# Altium footprint library Zmod.PcbLib: 229 footprints (part 3 of 15)
Each footprint in its own frame and in the unit in brackets; x right, y up, seen from the top. Pads: shape width x height; smd on the part's side, far side on the other; paste and mask are expansions set on the pad; w line width, h text height; cw(c..) or ccw(c..) is an arc to the next point about the centre after c.
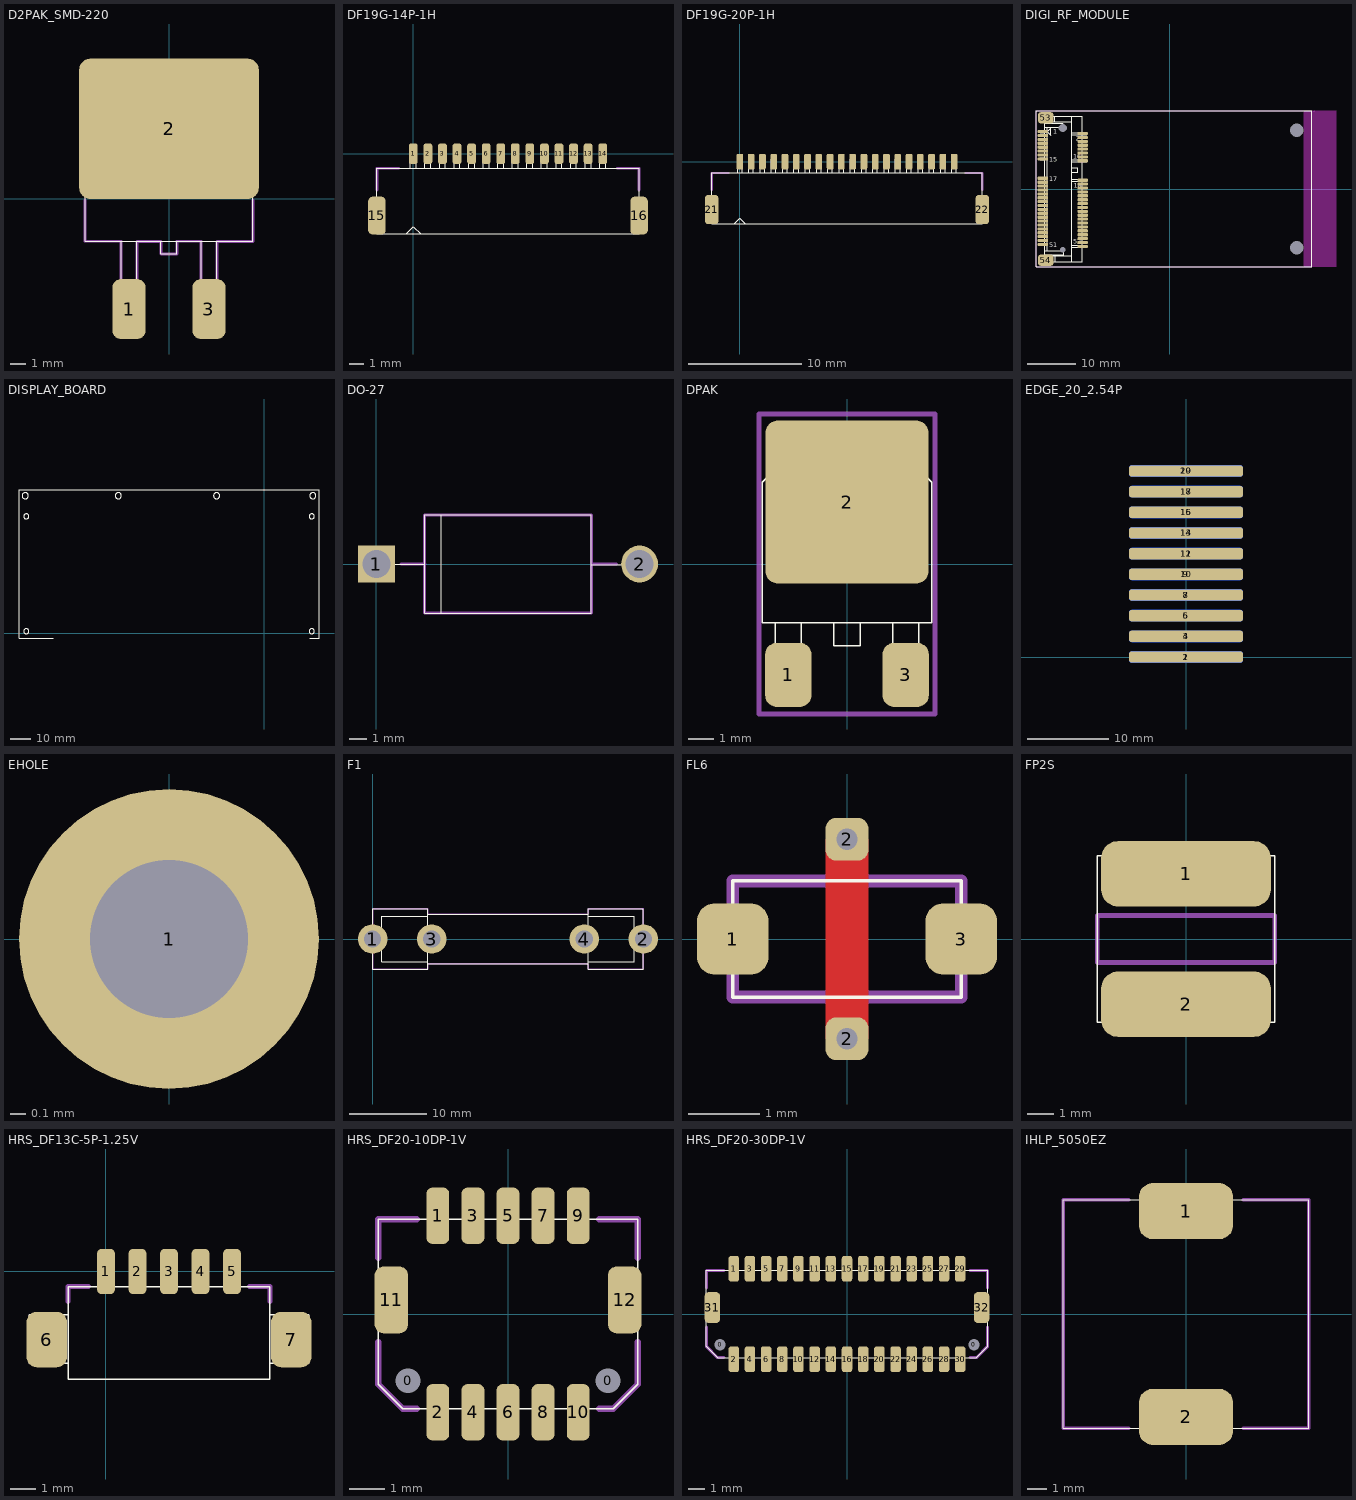
[diagram p2: the footprints below, top view; thin cyan lines are the x and y axes]

## D2PAK_SMD-220 [mm] "Internaiton Rectifier  Rev. 1"
height 4.9
pads (3):
  rrect50% 2.1x3.8 smd: 1(-2.54,-7) 3(2.54,-7)
  rrect15% 11.4x8.9 smd: 2(0,4.45)
Top Overlay:
  lines w0.05: -5.33,6.55 5.33,6.55 ; -3.04,-2.7 -3.04,-5.4 -2.04,-5.4 -2.04,-2.7 ; -2.88,-5.4 -2.88,-7.95 -2.21,-7.95 -2.21,-5.4 ; -0.51,-2.7 -0.51,-3.5 0.49,-3.5 0.49,-2.71 ; 2.04,-2.7 2.04,-5.4 3.04,-5.4 3.04,-2.7 ; 2.2,-5.4 2.2,-7.95 2.87,-7.95 2.87,-5.4 ; -5.33,-2.7 5.33,-2.7 5.33,6.67 4.05,7.95 -4.05,7.95 -5.33,6.67 -5.33,-2.7
Mechanical 15:
  lines w0.18: -5.33,-0.09 -5.33,-2.69 -3.04,-2.69 -3.04,-5.27 ; -2.04,-5.29 -2.04,-2.7 -0.5,-2.7 -0.5,-3.51 0.5,-3.51 0.5,-2.7 ; 0.51,-2.69 2.04,-2.69 2.04,-5.3 ; 3.04,-5.31 3.04,-2.7 5.33,-2.7 5.33,-0.08
  text ".Designator" at -5.055,-1.827 h1.5

## DF19G-14P-1H [mm] "HRS DF19 Series 1mm pitch, 14 way, board to cable, Rev.2"
height 1.65
pads (16):
  rrect50% 0.6x1.4 smd paste+0: 1(0,0) 2(1,0) 3(2,0) 4(3,0) 5(4,0) 6(5,0) 7(6,0) 8(7,0) 9(8,0) 10(9,0) 11(10,0) 12(11,0) 13(12,0) 14(13,0)
  rrect50% 1.2x2.6 smd: 15(-2.5,-4.25) 16(15.5,-4.25)
Top Overlay:
  lines w0.05: -0.5,-5.5 0,-5 0.5,-5.5 ; -0.2,-1 -0.2,0.2 0.2,0.2 0.2,-1 ; 0.8,-1 0.8,0.2 1.2,0.2 1.2,-1 ; 1.8,-1 1.8,0.2 2.2,0.2 2.2,-1 ; 2.8,-1 2.8,0.2 3.2,0.2 3.2,-1 ; 3.8,-1 3.8,0.2 4.2,0.2 4.2,-1 ; 4.8,-1 4.8,0.2 5.2,0.2 5.2,-1 ; 5.8,-1 5.8,0.2 6.2,0.2 6.2,-1 ; 6.8,-1 6.8,0.2 7.2,0.2 7.2,-1 ; 7.8,-1 7.8,0.2 8.2,0.2 8.2,-1 ; 8.8,-1 8.8,0.2 9.2,0.2 9.2,-1 ; 9.8,-1 9.8,0.2 10.2,0.2 10.2,-1 ; 10.8,-1 10.8,0.2 11.2,0.2 11.2,-1 ; 11.8,-1 11.8,0.2 12.2,0.2 12.2,-1 ; 12.8,-1 12.8,0.2 13.2,0.2 13.2,-1 ; -2.5,-5.5 -2.5,-1 15.5,-1 15.5,-5.5 -2.5,-5.5
Mechanical 15:
  lines w0.2: -2.5,-2.5 -2.5,-1 -1,-1 ; 14,-1 15.5,-1 15.5,-2.5
  text ".Designator" at -1.25,-3.75 h1.5

## DF19G-20P-1H [mm] "HRS DF19 Series 1mm pitch, 20 way, board to cable, Rev.2"
height 1.65
pads (22):
  rrect50% 0.6x1.4 smd paste+0: 1(0,0) 2(1,0) 3(2,0) 4(3,0) 5(4,0) 6(5,0) 7(6,0) 8(7,0) 9(8,0) 10(9,0) 11(10,0) 12(11,0) 13(12,0) 14(13,0) 15(14,0) 16(15,0) 17(16,0) 18(17,0) 19(18,0) 20(19,0)
  rrect50% 1.2x2.6 smd: 21(-2.5,-4.25) 22(21.5,-4.25)
Top Overlay:
  lines w0.05: -0.5,-5.5 0,-5 0.5,-5.5 ; -0.2,-1 -0.2,0.2 0.2,0.2 0.2,-1 ; 0.8,-1 0.8,0.2 1.2,0.2 1.2,-1 ; 1.8,-1 1.8,0.2 2.2,0.2 2.2,-1 ; 2.8,-1 2.8,0.2 3.2,0.2 3.2,-1 ; 3.8,-1 3.8,0.2 4.2,0.2 4.2,-1 ; 4.8,-1 4.8,0.2 5.2,0.2 5.2,-1 ; 5.8,-1 5.8,0.2 6.2,0.2 6.2,-1 ; 6.8,-1 6.8,0.2 7.2,0.2 7.2,-1 ; 7.8,-1 7.8,0.2 8.2,0.2 8.2,-1 ; 8.8,-1 8.8,0.2 9.2,0.2 9.2,-1 ; 9.8,-1 9.8,0.2 10.2,0.2 10.2,-1 ; 10.8,-1 10.8,0.2 11.2,0.2 11.2,-1 ; 11.8,-1 11.8,0.2 12.2,0.2 12.2,-1 ; 12.8,-1 12.8,0.2 13.2,0.2 13.2,-1 ; 13.8,-1 13.8,0.2 14.2,0.2 14.2,-1 ; 14.8,-1 14.8,0.2 15.2,0.2 15.2,-1 ; 15.8,-1 15.8,0.2 16.2,0.2 16.2,-1 ; 16.8,-1 16.8,0.2 17.2,0.2 17.2,-1 ; 17.8,-1 17.8,0.2 18.2,0.2 18.2,-1 ; 18.8,-1 18.8,0.2 19.2,0.2 19.2,-1 ; -2.5,-5.5 -2.5,-1 21.5,-1 21.5,-5.5 -2.5,-5.5
Mechanical 15:
  lines w0.2: -2.5,-2.5 -2.5,-1 -1,-1 ; 20,-1 21.5,-1 21.5,-2.5
  text ".Designator" at 1.5,-3.75 h1.5

## DIGI_RF_MODULE [mm] "317-0100-084 REV1"
height 4.1
pads (58):
  rrect50% 2.1x0.65 smd mask+0.102: 1(-26.125,11.8) 3(-26.125,11) 5(-26.125,10.2) 7(-26.125,9.4) 9(-26.125,8.6) 11(-26.125,7.8)
  rrect50% 2.1x0.65 smd: 2(-17.925,11.4) 4(-17.925,10.6) 6(-17.925,9.8) 8(-17.925,9) 10(-17.925,8.2) 12(-17.925,7.4) 13(-26.125,7) 14(-17.925,6.6) 15(-26.125,6.2) 16(-17.925,5.8) 17(-26.125,2.2) 18(-17.925,1.8) 19(-26.125,1.4) 20(-17.925,1) 21(-26.125,0.6) 22(-17.925,0.2) 23(-26.125,-0.2) 24(-17.925,-0.6) 25(-26.125,-1) 26(-17.925,-1.4) 27(-26.125,-1.8) 28(-17.925,-2.2) 29(-26.125,-2.6) 30(-17.925,-3) 31(-26.125,-3.4) 32(-17.925,-3.8) 33(-26.125,-4.2) 34(-17.925,-4.6) 35(-26.125,-5) 36(-17.925,-5.4) 37(-26.125,-5.8) 38(-17.925,-6.2) 39(-26.125,-6.6) 40(-17.925,-7) 41(-26.125,-7.4) 42(-17.925,-7.8) 43(-26.125,-8.2) 44(-17.925,-8.6) 45(-26.125,-9) 46(-17.925,-9.4) 47(-26.125,-9.8) 48(-17.925,-10.2) 49(-26.125,-10.6) 50(-17.925,-11) 51(-26.125,-11.4) 52(-17.925,-11.8)
  rrect50% 3.2x2.3 smd: 53(-25.525,14.65) 54(-25.525,-14.65)
  round 0.6 on Top hole 1.65 unplated: 55(-22.025,12.5)
  round 0.6 on Top hole 1.15 unplated: 56(-22.025,-12.5)
  round 0.6 on Top hole 2.8: 57(26.125,12.1) 58(26.125,-12.1)
Top Overlay:
  lines w0.05: -25.775,-11.2 -26.7,-11.2 -26.7,-11.6 -25.75,-11.6 ; -25.75,-13.775 -20.15,-13.775 ; -25.75,-13.525 -21.85,-13.525 -21.85,-12.7 -25.75,-12.7 ; -25.75,2 -26.7,2 -26.7,2.4 -25.75,2.4 ; -25.75,6 -26.7,6 -26.7,6.4 -25.75,6.4 ; -25.75,11.575 -26.7,11.575 -26.7,12 -25.75,12 ; -25.75,12.7 -21.85,12.7 -21.85,13.225 -22.15,13.525 -25.75,13.525 ; -25.75,13.825 -20.15,13.825 ; -25.241,11.791 -24.541,11.091 -24.54,12.516 ; -25.24,11.815 -24.54,12.515 ; -25.225,-12.7 -25.225,12.7 ; -23.625,13.825 -23.625,15 ; -23.6,-15 -23.6,-13.775 ; -20.15,-15 -20.15,15 ; -20.15,-12 -17.075,-12 -17.075,-11.575 -20.15,-11.575 ; -20.15,1.575 -17.075,1.575 -17.075,2 -20.15,2 ; -20.15,3.475 -18.975,3.475 -18.975,4.325 -20.15,4.325 ; -20.15,5.575 -17.05,5.575 -17.05,6 -20.15,6 ; -20.15,11.175 -17.05,11.175 -17.05,11.6 -20.15,11.6 ; -18,-12 -18,-15 -25.75,-15 -25.75,15 -18,15 -18,11.6 ; -18,-11.575 -18,1.575 ; -18,2 -18,5.575 ; -18,6 -18,11.175 ; -27.525,-16 -27.525,16.1 29.175,16.1 29.175,-16 -27.525,-16
  text "2" at -19.35,9.925 h1
  text "1" at -24,11.35 h1
  text "51" at -24.75,-12 h1
  text "17" at -24.75,1.6 h1
  text "16" at -19.875,6.2 h1
  text "15" at -24.75,5.6 h1
  text "18" at -19.775,0.3 h1
  text "52" at -19.9,-11.25 h1
Keep-Out Layer:
  region: 27.575,16.1 31.175,16.1 34.175,16.1 34.175,-16 27.575,-16
Mechanical 15:
  lines w0.18: -27.525,-16 -27.525,16.1 29.175,16.1 29.175,-16 -27.525,-16
  lines w0.254: 29.575,16.1 29.675,16
  text ".Designator" at -2.925,0.9 h1.5

## DISPLAY_BOARD [mm] "Size 145 x 72.5mm, Rev. 1"
height 16.5
pads (1):
  round 0 all layers, no hole: 1(0,0)
Top Overlay:
  circle w0.05: c23,56.5 r1.25
  circle w0.05: c-115,56.5 r1.25
  circle w0.05: c-115,1 r1.25
  circle w0.05: c23,1 r1.25
  circle w0.05: c-23,66.5 r1.5
  circle w0.05: c-70.5,66.5 r1.5
  circle w0.05: c23.5,66.5 r1.5
  circle w0.05: c-115.5,66.5 r1.5
  lines w0.05: -102,-2.5 -118.5,-2.5 -118.5,69.5 0.5,69.5 26.5,69.5 26.5,-2.5 22,-2.5
Mechanical 15:
  text ".Designator" at -0.762,0.381 h1.5

## DO-27 [mm] "DO-27, body length 9.5, diameter 5.6, lead diameter 1.3, Rev.1"
height 5.6
pads (2):
  rect 2.1x2.1 hole 1.6: 1(0,0)
  round 2.1 hole 1.6: 2(15,0)
Top Overlay:
  lines w0.05: 0.56,-0.01 2.719,-0.01 ; 3.7,-2.8 3.7,2.8 ; 12.251,-0.04 14.41,-0.04 ; 2.75,-2.8 12.25,-2.8 12.25,2.8 2.75,2.8 2.75,-2.8
Mechanical 15:
  lines w0.18: 1.4,0 2.778,0 ; 2.75,2.775 2.75,-2.8 12.25,-2.8 12.25,2.8 2.775,2.8 ; 12.3,0 13.678,0
  text ".Designator" at 3.35,-0.501 h1.5

## DPAK [mil]
height 100
pads (3):
  rrect50% 70.87x98.43 smd: 1(-90,-170) 3(90,-170)
  rrect15% 250x250 smd: 2(0,95)
Top Overlay:
  lines w1.97: -110,-90 -110,-195 -70,-195 -70,-90 ; -20,-90 -20,-125 20,-125 20,-90 ; 70,-90 70,-195 110,-195 110,-90 ; -105,150 -130,125 -130,-90 130,-90 130,125 105,150 ; -105,150 105,150 ; -105,150 -105,175 -85,195 85,195 105,175 105,150
Mechanical 15:
  lines w7.09: -135,-230 135,-230 135,230 -135,230 -135,-230
  text ".Designator" at -114.17,149.61 h59.06

## EDGE_20_2.54P [mm] "20 way edge finger connector, both sides. Rev. 1"
height 0.01
pads (20):
  rrect50% 14x1.4 smd far side paste+0: 1(0,0) 3(0,2.54) 5(0,5.08) 7(0,7.62) 9(0,10.16) 11(0,12.7) 13(0,15.24) 15(0,17.78) 17(0,20.32) 19(0,22.86)
  rrect50% 14x1.4 smd paste+0: 2(0,0) 4(0,2.54) 6(0,5.08) 8(0,7.62) 10(0,10.16) 12(0,12.7) 14(0,15.24) 16(0,17.78) 18(0,20.32) 20(0,22.86)
Top Solder:
  region: -7.112,23.622 7.112,23.622 7.112,-0.762 -7.112,-0.762 -7.112,23.622
Bottom Solder:
  region: -7.112,23.622 7.112,23.622 7.112,-0.762 -7.112,-0.762 -7.112,23.622

## EHOLE [mm]
pads (1):
  round 1.9 / inner round 1 / far side round 1.9 hole 1: 1(0,0)
Top Overlay:
  circle w0.05: c0,0 r0.508
Mechanical 15:
  text ".Designator" at -0.762,0.381 h1.5

## F1 [mm]
height 10.668
pads (4):
  round 3.8 / inner round 2.2 / far side round 3.8 hole 2.2: 1(0,0) 2(34.925,0) 3(7.62,0) 4(27.305,0)
Top Overlay:
  lines w0.05: 0,-0.762 1.143,-0.762 ; 0,0.762 1.143,0.762 ; 7.112,-3.175 27.813,-3.175 ; 7.112,-2.921 1.143,-2.921 1.143,2.921 7.112,2.921 ; 7.112,3.175 27.813,3.175 ; 27.813,-2.921 33.782,-2.921 33.782,2.921 27.813,2.921 ; 33.782,-0.762 34.925,-0.762 ; 33.782,0.762 34.925,0.762 ; 0,-3.937 7.112,-3.937 7.112,3.937 0,3.937 0,0 0,-3.937 ; 27.813,-3.937 34.925,-3.937 34.925,3.937 27.813,3.937 27.813,0 27.813,-3.937
Mechanical 15:
  lines w0.18: 0,-3.937 7.112,-3.937 7.112,-3.175 27.813,-3.175 27.813,-3.937 34.925,-3.937 34.925,3.937 27.813,3.937 27.813,3.175 7.112,3.175 7.112,3.937 0,3.937 0,0 0,-3.937
  text ".Designator" at 8.763,1.016 h1.52

## FL6 [mm]
height 1.905
pads (4):
  rrect50% 1x1 smd: 1(-1.6,0) 3(1.6,0)
  rrect50% 0.6x0.6 / inner round 0.3 / far side rrect50% 0.6x0.6 hole 0.3: 2(0,-1.397) 2(0,1.397)
Top Layer:
  rectangle: -0.3,-1.4 0.3,1.4
Top Overlay:
  lines w0.05: -1.6,-0.813 1.6,-0.813 1.6,0.813 -1.6,0.813 -1.6,-0.813
Mechanical 15:
  lines w0.18: -1.6,-0.813 1.6,-0.813 1.6,0.813 -1.6,0.813 -1.6,-0.813
  text ".Designator" at -2,-0.3 h1.5

## FP2S [mm] "CooperBussmann FP2-S Series"
height 3
pads (2):
  rrect50% 6.5x2.5 smd: 1(0,2.5) 2(0,-2.5)
Top Overlay:
  lines w0.05: -1.5,-3.2 -1.5,-3.6 1.5,-3.6 1.5,-3.2 ; -1.5,3.2 -1.5,3.6 1.5,3.6 1.5,3.2 ; -3.4,-3.2 3.4,-3.2 3.4,3.2 -3.4,3.2 -3.4,-3.2
Mechanical 15:
  lines w0.18: -3.4,-0.9 -3.4,0.9 3.4,0.9 3.4,-0.9 -3.4,-0.9
  text ".Designator" at -3.3,1.6 h1.5

## HRS_DF13C-5P-1.25V [mm] "HRS DF13 series 1.25 mm pitch, 5 way, plug., Rev. 2"
height 4.8
pads (7):
  rrect50% 0.7x1.8 smd paste+0: 1(0,0) 2(1.25,0) 3(2.5,0) 4(3.75,0) 5(5,0)
  rrect50% 1.6x2.2 smd: 6(-2.35,-2.7) 7(7.35,-2.7)
Top Overlay:
  lines w0.05: -0.975,-4.275 6.5,-4.275 6.5,-0.6 -1.5,-0.6 -1.5,-4.275 -0.675,-4.275 ; -0.2,-0.6 -0.2,0 -0.2,0.6 0.2,0.6 0.2,-0.6 ; 1.05,-0.575 1.05,0.025 1.05,0.625 1.45,0.625 1.45,-0.575 ; 2.3,-0.575 2.3,0.025 2.3,0.625 2.7,0.625 2.7,-0.575 ; 3.55,-0.575 3.55,0.025 3.55,0.625 3.95,0.625 3.95,-0.575 ; 4.8,-0.6 4.8,0 4.8,0.6 5.2,0.6 5.2,-0.6 ; -3.05,-3.65 -3.05,-1.725 -1.5,-1.725 -1.5,-3.65 -3.05,-3.65 ; 6.5,-3.65 8.05,-3.65 8.05,-1.725 6.5,-1.725 6.5,-3.65
Mechanical 15:
  lines w0.2: -1.5,-1.2 -1.5,-0.6 -0.7,-0.6 ; 5.7,-0.6 6.5,-0.6 6.5,-1.2
  text ".Designator" at -0.375,-3.05 h1.5

## HRS_DF20-10DP-1V [mm] "Hirose DF20 series 1 mm pitch, 10 way, plug. Rev. 2"
height 4.6
pads (14):
  round 0.5 hole 0.7 unplated: 0(-2.85,-1.9) 0(2.85,-1.9)
  rrect50% 0.65x1.6 smd paste+0: 1(-2,2.8) 2(-2,-2.8) 3(-1,2.8) 4(-1,-2.8) 5(0,2.8) 6(0,-2.8) 7(1,2.8) 8(1,-2.8) 9(2,2.8) 10(2,-2.8)
  rrect50% 0.95x1.9 smd: 11(-3.325,0.4) 12(3.325,0.4)
Top Overlay:
  lines w0.05: -3.7,-2 -3.7,1.9 -3.7,2.7 3.7,2.7 3.7,-2 3,-2.7 -3,-2.7 -3.7,-2
Mechanical 15:
  lines w0.18: -3.7,-0.8 -3.7,-2 -3,-2.7 -2.6,-2.7 ; -3.7,1.6 -3.7,2.7 -2.6,2.7 ; 2.6,-2.7 3,-2.7 3.7,-2 3.7,-0.8 ; 2.6,2.7 3.7,2.7 3.7,1.6
  text ".Designator" at -1.8,-0.6 h1.5

## HRS_DF20-30DP-1V [mm] "Hirose DF20 series 1 mm pitch, 30 way, plug. Rev. 2"
height 4.6
pads (34):
  round 0.5 hole 0.7 unplated: 0(-7.85,-1.9) 0(7.85,-1.9)
  rrect50% 0.65x1.6 smd paste+0: 1(-7,2.8) 2(-7,-2.8) 3(-6,2.8) 4(-6,-2.8) 5(-5,2.8) 6(-5,-2.8) 7(-4,2.8) 8(-4,-2.8) 9(-3,2.8) 10(-3,-2.8) 11(-2,2.8) 12(-2,-2.8) 13(-1,2.8) 14(-1,-2.8) 15(0,2.8) 16(0,-2.8) 17(1,2.8) 18(1,-2.8) 19(2,2.8) 20(2,-2.8) 21(3,2.8) 22(3,-2.8) 23(4,2.8) 24(4,-2.8) 25(5,2.8) 26(5,-2.8) 27(6,2.8) 28(6,-2.8) 29(7,2.8) 30(7,-2.8)
  rrect50% 0.95x1.9 smd: 31(-8.325,0.4) 32(8.325,0.4)
Top Overlay:
  lines w0.05: -8.7,-2 -8,-2.7 -0.4,-2.7 8,-2.7 8.7,-2 8.7,2.7 -8.7,2.7 -8.7,1.9 -8.7,-2
Mechanical 15:
  lines w0.18: -8.7,-0.8 -8.7,-2 -8,-2.7 -7.6,-2.7 ; -8.7,1.6 -8.7,2.7 -7.6,2.7 ; 7.6,-2.7 8,-2.7 8.7,-2 8.7,-0.8 ; 7.6,2.7 8.7,2.7 8.7,1.6
  text ".Designator" at -7.4,-0.4 h1.5

## IHLP_5050EZ [mm] "Vishay Dale IHLP-5050EZ-01 Series"
height 5
pads (2):
  rrect50% 4.95x2.95 smd: 1(0,5.4) 2(0,-5.4)
Top Overlay:
  lines w0.05: -2,-6 -2,-6.6 2,-6.6 2,-6 ; -2,6 -2,6.6 2,6.6 2,6 ; -6.45,-6 6.45,-6 6.45,6 -6.45,6 -6.45,-6
Mechanical 15:
  lines w0.18: -3,-6 -6.45,-6 -6.45,6 -3,6 ; 3,-6 6.45,-6 6.45,6 3,6
  text ".Designator" at -5.824,1.692 h1.5